# Altium footprint library HW_HOLLAND_NCDM_MONITOR_R1.PcbLib: 472 footprints (part 24 of 30)
Each footprint in its own frame and in the unit in brackets; x right, y up, seen from the top. Pads: shape width x height; smd on the part's side, far side on the other; paste and mask are expansions set on the pad; w line width, h text height; cw(c..) or ccw(c..) is an arc to the next point about the centre after c.
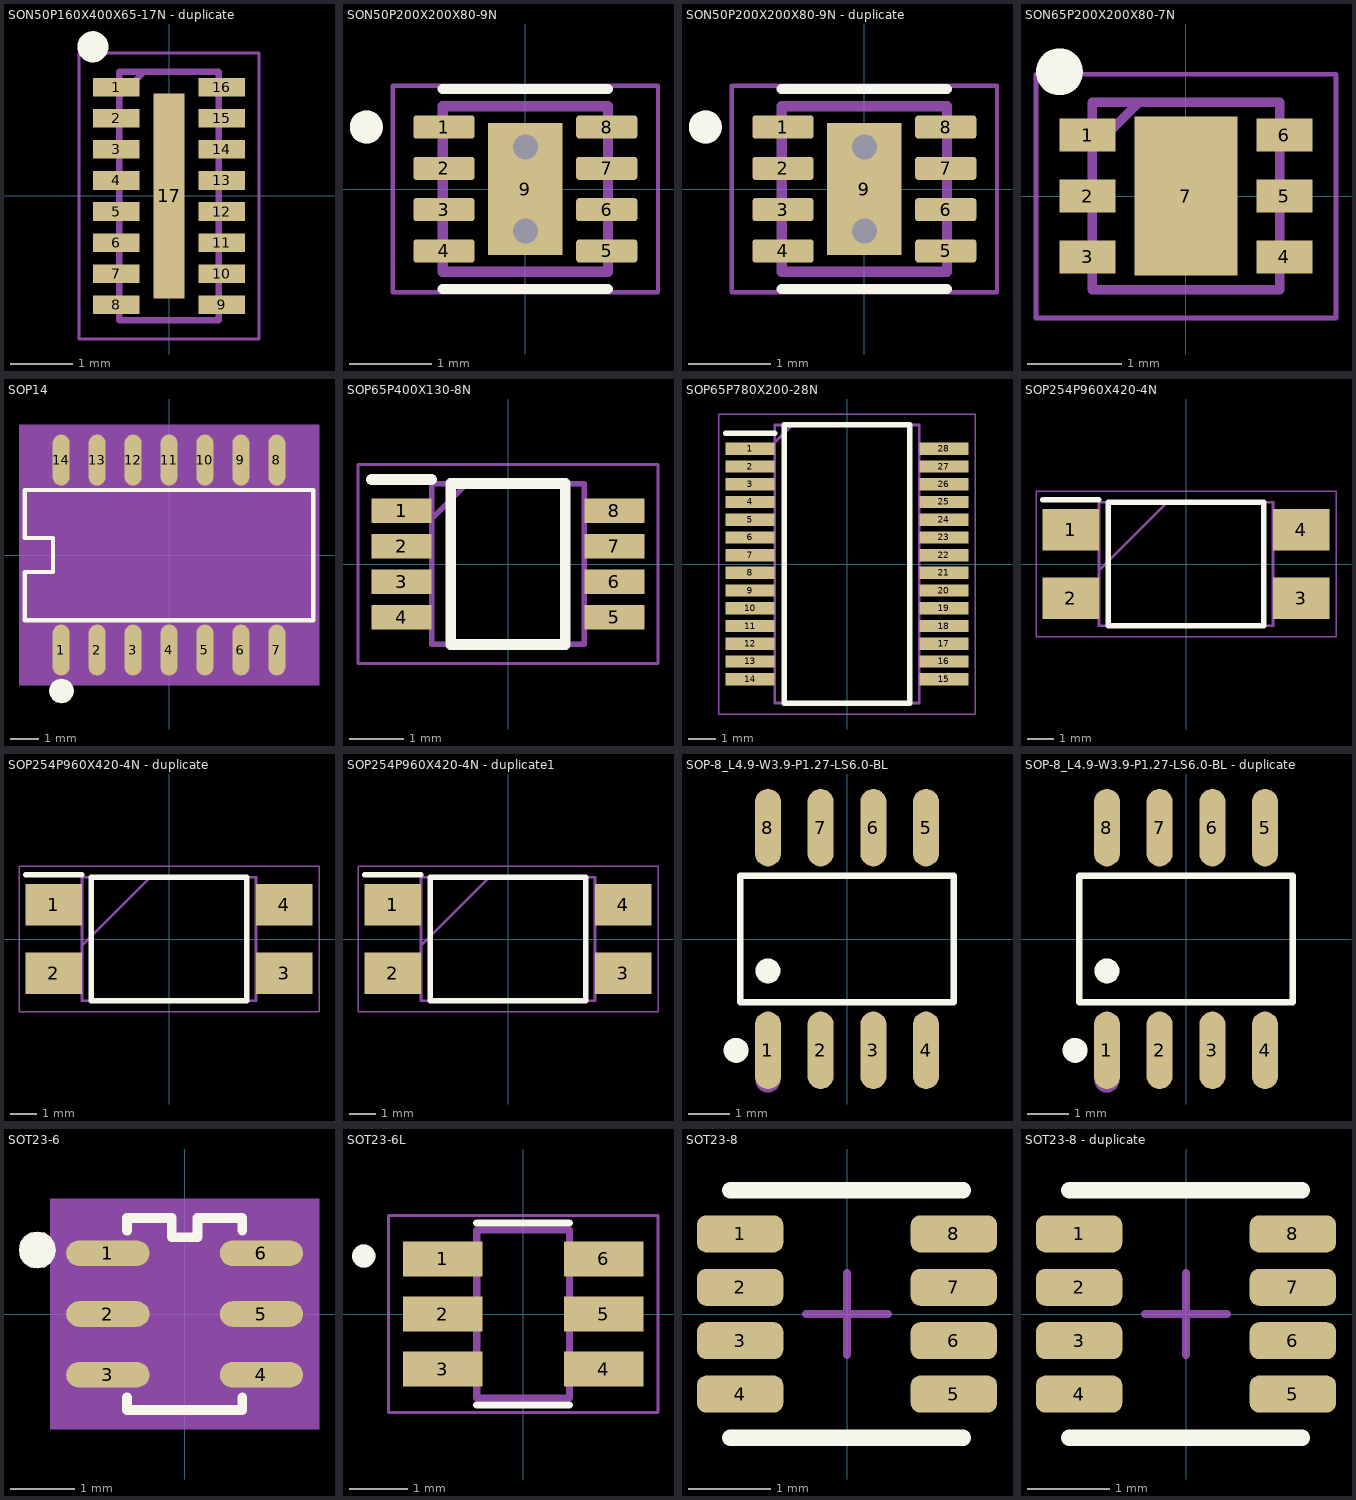
[diagram p23: the footprints below, top view; thin cyan lines are the x and y axes]

## SON50P160X400X65-17N - duplicate [mm]
height 0.52
pads (17):
  rect 0.75x0.3 smd: 1(-0.85,1.75) 2(-0.85,1.25) 3(-0.85,0.75) 4(-0.85,0.25) 5(-0.85,-0.25) 6(-0.85,-0.75) 7(-0.85,-1.25) 8(-0.85,-1.75) 9(0.85,-1.75) 10(0.85,-1.25) 11(0.85,-0.75) 12(0.85,-0.25) 13(0.85,0.25) 14(0.85,0.75) 15(0.85,1.25) 16(0.85,1.75)
  rect 0.5x3.3 smd: 17(0,0)
Top Overlay:
  circle w0.25: c-1.225,2.4 r0.125
Mechanical 13:
  lines w0.1: -0.8,1.6 -0.4,2 ; -0.8,-2 -0.8,2 0.8,2 0.8,-2 -0.8,-2
Mechanical 15:
  lines w0.05: -1.45,-2.3 -1.45,2.3 1.45,2.3 1.45,-2.3 -1.45,-2.3
3D body "ECLAMP2410PQTCT.stp": height 0.65, standoff 0, extent -0.85,-2 0.85,2

## SON50P200X200X80-9N [mm]
pads (9):
  rrect25% 0.74x0.28 smd: 1(-0.985,0.75) 2(-0.985,0.25) 3(-0.985,-0.25) 4(-0.985,-0.75) 5(0.985,-0.75) 6(0.985,-0.25) 7(0.985,0.25) 8(0.985,0.75)
  rect 0.9x1.6 smd paste-2: 9(0,0)
via 0,0.508 diameter 0.508 hole 0.3
via 0,-0.508 diameter 0.508 hole 0.3
Top Overlay:
  circle w0.2: c-1.925,0.75 r0.1
  lines w0.127: -1,-1.21 1,-1.21 ; -1,1.21 1,1.21
Top Paste:
  region: 0.28,-0.51 -0.28,-0.51 -0.28,0.51 0.28,0.51
Mechanical 13:
  circle w0.2: c-1.925,0.75 r0.1
  lines w0.127: -1,-1 1,-1 1,1 -1,1 -1,-1
Mechanical 15:
  lines w0.05: -1.605,-1.25 1.605,-1.25 1.605,1.25 -1.605,1.25 -1.605,-1.25
3D body "step_temp.STEP": height 0.8, standoff 0, extent -1,-1 1,1

## SON50P200X200X80-9N - duplicate [mm]
pads (9):
  rrect25% 0.74x0.28 smd: 1(-0.985,0.75) 2(-0.985,0.25) 3(-0.985,-0.25) 4(-0.985,-0.75) 5(0.985,-0.75) 6(0.985,-0.25) 7(0.985,0.25) 8(0.985,0.75)
  rect 0.9x1.6 smd paste-2: 9(0,0)
via 0,-0.508 diameter 0.508 hole 0.3
via 0,0.508 diameter 0.508 hole 0.3
Top Overlay:
  circle w0.2: c-1.925,0.75 r0.1
  lines w0.127: -1,-1.21 1,-1.21 ; -1,1.21 1,1.21
Top Paste:
  region: 0.28,-0.51 -0.28,-0.51 -0.28,0.51 0.28,0.51
Mechanical 13:
  circle w0.2: c-1.925,0.75 r0.1
  lines w0.127: -1,-1 -1,1 1,1 1,-1 -1,-1
Mechanical 15:
  lines w0.05: -1.605,-1.25 -1.605,1.25 1.605,1.25 1.605,-1.25 -1.605,-1.25
3D body "step_temp.STEP": height 0.8, standoff 0, extent -1,-1 1,1

## SON65P200X200X80-7N [mm]
pads (7):
  rect 0.6x0.35 smd: 1(-1.05,0.65) 2(-1.05,0) 3(-1.05,-0.65) 4(1.05,-0.65) 5(1.05,0) 6(1.05,0.65)
  rect 1.1x1.7 smd: 7(0,0)
Top Overlay:
  circle w0.25: c-1.35,1.325 r0.125
Mechanical 15:
  lines w0.1: -1,0.5 -0.5,1 ; -1,-1 1,-1 1,1 -1,1 -1,-1
Mechanical 20:
  lines w0.05: -1.6,-1.3 1.6,-1.3 1.6,1.3 -1.6,1.3 -1.6,-1.3
3D body "TPS3808G01DRVR.stp": height 0.8, standoff 0, extent -1,-1 1,1

## SOP14 [mm]
pads (14):
  oval 0.6x1.8 smd: 1(-3.81,-3.355) 2(-2.54,-3.355) 3(-1.27,-3.355) 4(0,-3.355) 5(1.27,-3.355) 6(2.54,-3.355) 7(3.81,-3.355) 8(3.81,3.355) 9(2.54,3.355) 10(1.27,3.355) 11(0,3.355) 12(-1.27,3.355) 13(-2.54,3.355) 14(-3.81,3.355)
Top Overlay:
  dashed: -3.8,-4.367 -3.966,-4.4 -4.106,-4.494 -4.2,-4.634 -4.233,-4.8 -4.2,-4.966 -4.168,-5.013 -4.106,-5.106 -3.966,-5.2 -3.8,-5.233 -3.634,-5.2 -3.494,-5.106 -3.432,-5.013 -3.4,-4.966 -3.367,-4.8 -3.4,-4.634 -3.494,-4.494 -3.634,-4.4
  lines w0.152: -5.1,-2.3 5.1,-2.3 5.1,2.3 -5.1,2.3 -5.1,0.6 -4.1,0.6 -4.1,-0.6 -5.1,-0.6 -5.1,-2.3
  text ".Designator" at 0.953,0.212 h0.64
Top Assembly:
  dashed: -3.8,-4.367 -3.966,-4.4 -4.106,-4.494 -4.2,-4.634 -4.233,-4.8 -4.2,-4.966 -4.168,-5.013 -4.106,-5.106 -3.966,-5.2 -3.8,-5.233 -3.634,-5.2 -3.494,-5.106 -3.432,-5.013 -3.4,-4.966 -3.367,-4.8 -3.4,-4.634 -3.494,-4.494 -3.634,-4.4
  lines w0.025: -5.1,-2.3 -5.1,-0.6 -4.1,-0.6 -4.1,0.6 -5.1,0.6 -5.1,2.3 5.1,2.3 5.1,-2.3 -5.1,-2.3
Top 3D Body:
  region: -5.3,4.6 -5.3,-4.6 5.3,-4.6 5.3,4.6
Mechanical 17:
  text "13" at -2.54,1.75 h2.01
  text "7" at 3.81,-4.158 h2.01
  text "2" at -2.54,-4.158 h2.01
  text "10" at 1.27,1.75 h2.01
  text "1" at -3.81,-4.158 h2.01
  text "12" at -1.27,1.75 h2.01
  text "5" at 1.27,-4.158 h2.01
  text "3" at -1.27,-4.158 h2.01
  text "6" at 2.54,-4.158 h2.01
  text "8" at 3.81,2.552 h2.01
  text "9" at 2.54,2.552 h2.01
  text "4" at 0,-4.158 h2.01
  text "14" at -3.81,1.75 h2.01
  text "11" at 0,1.75 h2.01
3D body: height 3.81, standoff 0, extent -5.3,-4.6 5.3,4.6

## SOP65P400X130-8N [mm]
pads (8):
  rect 1.1x0.45 smd: 1(-1.95,0.975) 2(-1.95,0.325) 3(-1.95,-0.325) 4(-1.95,-0.975) 5(1.95,-0.975) 6(1.95,-0.325) 7(1.95,0.325) 8(1.95,0.975)
Top Overlay:
  lines w0.2: -2.5,1.55 -1.4,1.55 ; -1.05,-1.475 1.05,-1.475 1.05,1.475 -1.05,1.475 -1.05,-1.475
Mechanical 15:
  lines w0.1: -1.4,0.825 -0.75,1.475 ; -1.4,-1.475 1.4,-1.475 1.4,1.475 -1.4,1.475 -1.4,-1.475
Mechanical 20:
  lines w0.05: -2.75,-1.825 2.75,-1.825 2.75,1.825 -2.75,1.825 -2.75,-1.825
3D body "TXS0102DCTT.stp": height 0.91, standoff 0, extent -2.01,-1.475 2.01,1.475

## SOP65P780X200-28N [mm]
pads (28):
  rect 1.8x0.45 smd: 1(-3.55,4.225) 2(-3.55,3.575) 3(-3.55,2.925) 4(-3.55,2.275) 5(-3.55,1.625) 6(-3.55,0.975) 7(-3.55,0.325) 8(-3.55,-0.325) 9(-3.55,-0.975) 10(-3.55,-1.625) 11(-3.55,-2.275) 12(-3.55,-2.925) 13(-3.55,-3.575) 14(-3.55,-4.225) 15(3.55,-4.225) 16(3.55,-3.575) 17(3.55,-2.925) 18(3.55,-2.275) 19(3.55,-1.625) 20(3.55,-0.975) 21(3.55,-0.325) 22(3.55,0.325) 23(3.55,0.975) 24(3.55,1.625) 25(3.55,2.275) 26(3.55,2.925) 27(3.55,3.575) 28(3.55,4.225)
Top Overlay:
  lines w0.2: -4.45,4.8 -2.65,4.8 ; -2.3,-5.1 -2.3,5.1 2.3,5.1 2.3,-5.1 -2.3,-5.1
Mechanical 13:
  lines w0.1: -2.65,4.45 -2,5.1 ; -2.65,-5.1 -2.65,5.1 2.65,5.1 2.65,-5.1 -2.65,-5.1
Mechanical 15:
  lines w0.05: -4.7,-5.5 -4.7,5.5 4.7,5.5 4.7,-5.5 -4.7,-5.5
3D body "MCP23017T-E_SS.stp": height 2, standoff 0, extent -3.9,-5.1 3.9,5.1

## SOP254P960X420-4N [mm]
pads (4):
  rect 2.1x1.55 smd: 1(-4.3,1.27) 2(-4.3,-1.27) 3(4.3,-1.27) 4(4.3,1.27)
Top Overlay:
  lines w0.2: -5.35,2.395 -3.25,2.395 ; -2.9,-2.3 -2.9,2.3 2.9,2.3 2.9,-2.3 -2.9,-2.3
Mechanical 13:
  lines w0.1: -3.25,-0.24 -0.71,2.3 ; -3.25,-2.3 -3.25,2.3 3.25,2.3 3.25,-2.3 -3.25,-2.3
Mechanical 15:
  lines w0.05: -5.6,-2.725 -5.6,2.725 5.6,2.725 5.6,-2.725 -5.6,-2.725
3D body "PC81710NIP1B.stp": height 4.2, standoff 0, extent -4.8,-2.3 4.8,2.3

## SOP254P960X420-4N - duplicate [mm]
pads (4):
  rect 2.1x1.55 smd: 1(-4.3,1.27) 2(-4.3,-1.27) 3(4.3,-1.27) 4(4.3,1.27)
Top Overlay:
  lines w0.2: -5.35,2.395 -3.25,2.395 ; -2.9,-2.3 -2.9,2.3 2.9,2.3 2.9,-2.3 -2.9,-2.3
Mechanical 13:
  lines w0.1: -3.25,-0.24 -0.71,2.3 ; -3.25,-2.3 -3.25,2.3 3.25,2.3 3.25,-2.3 -3.25,-2.3
Mechanical 15:
  lines w0.05: -5.6,-2.725 -5.6,2.725 5.6,2.725 5.6,-2.725 -5.6,-2.725
3D body "PC81710NIP1B.stp": height 4.2, standoff 0, extent -4.8,-2.3 4.8,2.3

## SOP254P960X420-4N - duplicate1 [mm]
pads (4):
  rect 2.1x1.55 smd: 1(-4.3,1.27) 2(-4.3,-1.27) 3(4.3,-1.27) 4(4.3,1.27)
Top Overlay:
  lines w0.2: -5.35,2.395 -3.25,2.395 ; -2.9,-2.3 -2.9,2.3 2.9,2.3 2.9,-2.3 -2.9,-2.3
Mechanical 13:
  lines w0.1: -3.25,-0.24 -0.71,2.3 ; -3.25,-2.3 -3.25,2.3 3.25,2.3 3.25,-2.3 -3.25,-2.3
Mechanical 15:
  lines w0.05: -5.6,-2.725 -5.6,2.725 5.6,2.725 5.6,-2.725 -5.6,-2.725
3D body "PC81710NIP1B.stp": height 4.2, standoff 0, extent -4.8,-2.3 4.8,2.3

## SOP-8_L4.9-W3.9-P1.27-LS6.0-BL [mm]
pads (8):
  oval 0.63x1.865 smd: 1(-1.905,-2.682) 2(-0.635,-2.682) 3(0.635,-2.682) 4(1.905,-2.682) 5(1.905,2.682) 6(0.635,2.682) 7(-0.635,2.682) 8(-1.905,2.682)
Top Overlay:
  circle w0.3: c-2.672,-2.682 r0.15
  circle w0.3: c-1.905,-0.769 r0.15
  lines w0.152: -2.576,-1.521 2.576,-1.521 2.576,1.521 -2.576,1.521 -2.576,-1.521
Mechanical 15:
  circle w0.3: c-1.905,-3.4 r0.15
3D body "SOIC8-150-50.STEP": height 1.91, standoff 0, extent -2.45,-3 2.45,3

## SOP-8_L4.9-W3.9-P1.27-LS6.0-BL - duplicate [mm]
pads (8):
  oval 0.63x1.865 smd: 1(-1.905,-2.682) 2(-0.635,-2.682) 3(0.635,-2.682) 4(1.905,-2.682) 5(1.905,2.682) 6(0.635,2.682) 7(-0.635,2.682) 8(-1.905,2.682)
Top Overlay:
  circle w0.3: c-1.905,-0.769 r0.15
  circle w0.3: c-2.672,-2.682 r0.15
  lines w0.152: -2.576,-1.521 -2.576,1.521 2.576,1.521 2.576,-1.521 -2.576,-1.521
Mechanical 15:
  circle w0.3: c-1.905,-3.4 r0.15
3D body "SOIC8-150-50.STEP": height 1.91, standoff 0, extent -2.45,-3 2.45,3

## SOT23-6 [mm]
pads (6):
  oval 1.3x0.4 smd: 1(-1.2,0.95) 2(-1.2,0) 3(-1.2,-0.95) 4(1.2,-0.95) 5(1.2,0) 6(1.2,0.95)
Top Overlay:
  dashed: -2.012,1 -2.034,1.11 -2.096,1.204 -2.19,1.266 -2.3,1.288 -2.41,1.266 -2.442,1.245 -2.504,1.204 -2.566,1.11 -2.588,1 -2.566,0.89 -2.504,0.796 -2.442,0.755 -2.41,0.734 -2.3,0.712 -2.19,0.734 -2.096,0.796 -2.034,0.89
  lines w0.152: -0.9,-1.3 -0.9,-1.5 0.9,-1.5 0.9,-1.3 ; -0.9,1.3 -0.9,1.5 -0.2,1.5 -0.2,1.2 0.2,1.2 0.2,1.5 0.9,1.5 0.9,1.3
  text ".Designator" at -0.635,-0.212 h0.64
Top Assembly:
  dashed: -2.012,1 -2.034,1.11 -2.096,1.204 -2.19,1.266 -2.3,1.288 -2.41,1.266 -2.442,1.245 -2.504,1.204 -2.566,1.11 -2.588,1 -2.566,0.89 -2.504,0.796 -2.442,0.755 -2.41,0.734 -2.3,0.712 -2.19,0.734 -2.096,0.796 -2.034,0.89
  lines w0.025: -0.9,-1.5 -0.9,1.5 -0.2,1.5 -0.2,1.2 0.2,1.2 0.2,1.5 0.9,1.5 0.9,-1.5 -0.9,-1.5
Top 3D Body:
  region: -2.1,1.8 2.1,1.8 2.1,-1.8 -2.1,-1.8
Mechanical 17:
  text "4" at 1.2,-0.95 h0.64
  text "1" at -1.2,0.95 h0.64
  text "6" at 1.2,0.95 h0.64
  text "3" at -1.2,-0.95 h0.64
  text "2" at -1.2,0 h0.64
  text "5" at 1.2,0 h0.64
3D body: height 3.81, standoff 0, extent -2.1,-1.8 2.1,1.8

## SOT23-6L [mm]
pads (6):
  rect 1.375x0.6 smd: 1(-1.389,0.95) 2(-1.389,0) 3(-1.389,-0.95) 4(1.389,-0.95) 5(1.389,0) 6(1.389,0.95)
Top Overlay:
  circle w0.2: c-2.75,1 r0.1
  lines w0.127: -0.8,-1.57 0.8,-1.57 ; -0.8,1.57 0.8,1.57
Mechanical 13:
  circle w0.2: c-2.75,1 r0.1
  lines w0.127: -0.8,-1.45 0.8,-1.45 0.8,1.45 -0.8,1.45 -0.8,-1.45
Mechanical 15:
  lines w0.05: -2.326,-1.7 -2.326,1.7 2.326,1.7 2.326,-1.7 -2.326,-1.7

## SOT23-8 [mm]
pads (8):
  rrect50% 1.05x0.45 smd: 1(-1.3,0.975) 2(-1.3,0.325) 3(-1.3,-0.325) 4(-1.3,-0.975) 5(1.3,-0.975) 6(1.3,-0.325) 7(1.3,0.325) 8(1.3,0.975)
Top Overlay:
  lines w0.2: -1.42,-1.505 1.411,-1.505 ; -1.42,1.505 1.411,1.505
Mechanical 15:
  lines w0.1: -0.5,0 0.5,0 ; 0,-0.5 0,0.5
3D body "SOT23-8.stp": height 1.2, standoff 0.02, extent -1.418,-1.5 1.418,1.5

## SOT23-8 - duplicate [mm]
pads (8):
  rrect50% 1.05x0.45 smd: 1(-1.3,0.975) 2(-1.3,0.325) 3(-1.3,-0.325) 4(-1.3,-0.975) 5(1.3,-0.975) 6(1.3,-0.325) 7(1.3,0.325) 8(1.3,0.975)
Top Overlay:
  lines w0.2: -1.42,-1.505 1.411,-1.505 ; -1.42,1.505 1.411,1.505
Mechanical 15:
  lines w0.1: -0.5,0 0.5,0 ; 0,-0.5 0,0.5
3D body "SOT23-8.stp": height 1.2, standoff 0.02, extent -1.418,-1.5 1.418,1.5